# Altium footprint library CD's_LIB_2018.PcbLib: 155 footprints (part 9 of 10)
Each footprint in its own frame and in the unit in brackets; x right, y up, seen from the top. Pads: shape width x height; smd on the part's side, far side on the other; paste and mask are expansions set on the pad; w line width, h text height; cw(c..) or ccw(c..) is an arc to the next point about the centre after c.
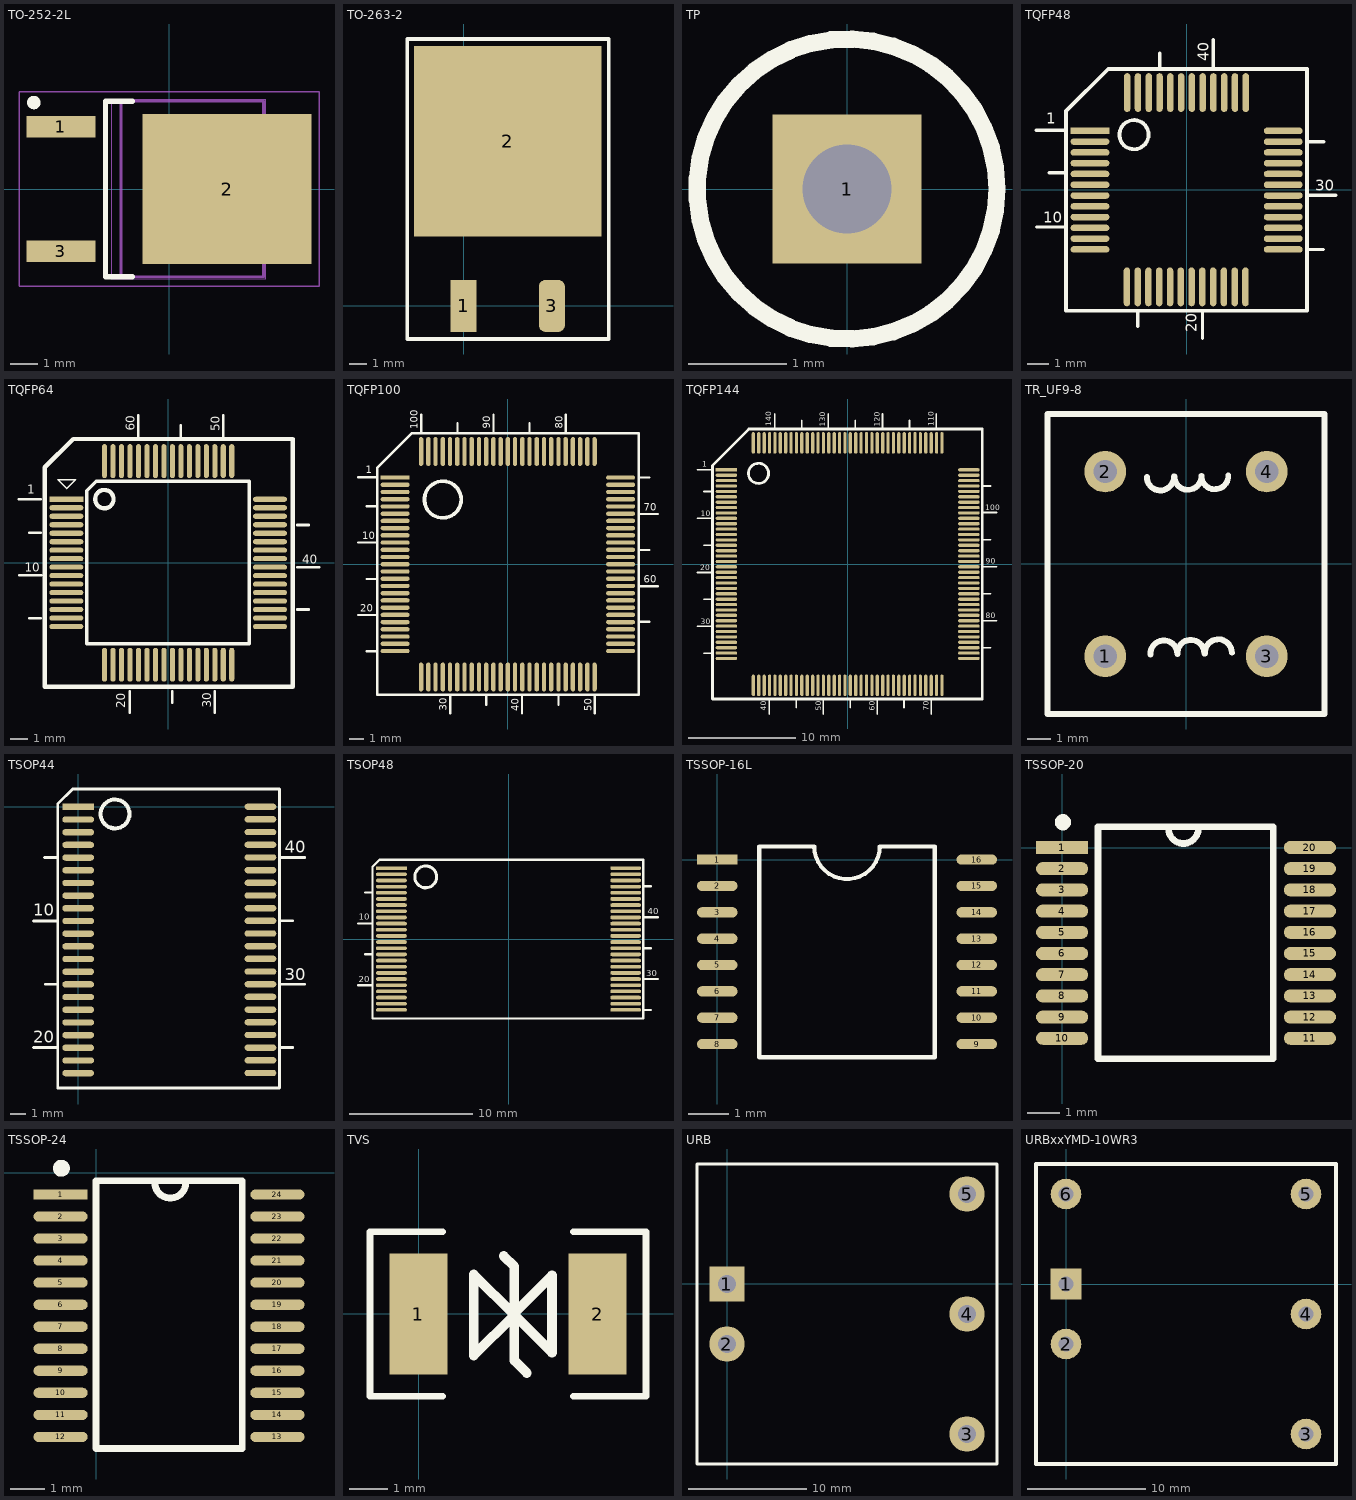
[diagram p8: the footprints below, top view; thin cyan lines are the x and y axes]

## TO-252-2L [mm]
height 2.4
pads (3):
  rect 2.55x0.8 smd: 1(-4,2.3) 3(-4,-2.3)
  rect 6.25x5.55 smd: 2(2.15,0)
Top Overlay:
  circle w0.25: c-5,3.2 r0.125
  lines w0.2: -1.35,-3.25 -2.35,-3.25 -2.35,3.25 -1.35,3.25
Top Paste:
  region: 2.51,0.36 4.55,0.36 4.55,2.06 2.51,2.06
  region: -0.25,0.36 1.79,0.36 1.79,2.06 -0.25,2.06
  region: 2.51,-2.06 4.55,-2.06 4.55,-0.36 2.51,-0.36
  region: -0.25,-2.06 1.79,-2.06 1.79,-0.36 -0.25,-0.36
Mechanical 1:
  lines w0.1: 3.5,-2.668 3.946,-2.668 4.85,-1.666 4.85,1.666 3.946,2.668 3.5,2.668 ; -1.778,-3.25 -1.778,3.25 3.5,3.25 3.5,-3.25 -1.778,-3.25
Mechanical 16:
  circle w0.05: c0,0 r0.35
  lines w0.001: -2.125,-3.325 -2.125,3.325 3.575,3.325 3.575,-3.325 -2.125,-3.325
  lines w0.05: -0.5,0 0.5,0 ; 0,-0.5 0,0.5 ; -5.55,-3.6 -5.55,3.6 5.55,3.6 5.55,-3.6 -5.55,-3.6

## TO-263-2 [mm]
pads (3):
  rect 1.5x3 smd: 1(0,0)
  rect 10.8x11 smd: 2(2.54,9.5)
  rrect50% 1.5x3 smd: 3(5.08,0)
Top Overlay:
  lines w0.203: -3.251,-1.909 8.357,-1.909 8.357,15.393 -3.251,15.393 -3.251,-1.909

## TP [mil]
pads (1):
  rect 60x60 hole 36: 1(0,0)
Top Overlay:
  circle w7: c0,0 r60.41

## TQFP48 [mm]
pads (48):
  rect 1.8x0.3 smd: 1(-4.483,2.731)
  oval 1.8x0.3 smd: 2(-4.483,2.231) 3(-4.483,1.731) 4(-4.483,1.231) 5(-4.483,0.731) 6(-4.483,0.231) 7(-4.483,-0.269) 8(-4.483,-0.769) 9(-4.483,-1.269) 10(-4.483,-1.769) 11(-4.483,-2.269) 12(-4.483,-2.769) 25(4.483,-2.769) 26(4.483,-2.269) 27(4.483,-1.769) 28(4.483,-1.269) 29(4.483,-0.769) 30(4.483,-0.269) 31(4.483,0.231) 32(4.483,0.731) 33(4.483,1.231) 34(4.483,1.731) 35(4.483,2.231) 36(4.483,2.731)
  oval 0.3x1.8 smd: 13(-2.769,-4.508) 14(-2.269,-4.508) 15(-1.769,-4.508) 16(-1.269,-4.508) 17(-0.769,-4.508) 18(-0.269,-4.508) 19(0.231,-4.508) 20(0.731,-4.508) 21(1.231,-4.508) 22(1.731,-4.508) 23(2.231,-4.508) 24(2.73,-4.508) 37(2.744,4.509) 38(2.244,4.509) 39(1.744,4.509) 40(1.244,4.509) 41(0.744,4.509) 42(0.244,4.509) 43(-0.256,4.509) 44(-0.756,4.509) 45(-1.256,4.509) 46(-1.756,4.509) 47(-2.256,4.509) 48(-2.756,4.509)
Top Overlay:
  circle w0.178: c-2.442,2.553 r0.676
  lines w0.152: -6.988,2.764 -5.718,2.764 ; -6.962,-1.732 -5.692,-1.732 ; -6.378,0.783 -5.718,0.783 ; -2.263,-6.329 -2.263,-5.669 ; -1.247,5.685 -1.247,6.345 ; 0.734,-6.888 0.734,-5.618 ; 1.242,5.685 1.242,6.955 ; 5.662,-0.259 6.932,-0.259 ; 5.687,-2.773 6.347,-2.773 ; 5.712,2.23 6.373,2.23
  lines w0.178: -5.591,-5.618 -5.591,3.655 -3.637,5.609 5.585,5.609 5.585,-5.618 -5.591,-5.618
  text "40" at 1.039,5.964 h0.51
  text "20" at 0.48,-6.609 h0.51
  text "10" at -6.657,-1.529 h0.51
  text "1" at -6.505,3.069 h0.51
  text "30" at 5.966,-0.056 h0.51
3D body: height 1.1, standoff 0, extent -4.509,-4.508 4.509,4.509

## TQFP64 [mm]
height 1.4
pads (64):
  rect 2x0.3 smd mask+0.102: 1(-6,3.75)
  oval 2x0.3 smd mask+0.102: 2(-6,3.25) 3(-6,2.75) 4(-6,2.25) 5(-6,1.75) 6(-6,1.25) 7(-6,0.75) 8(-6,0.25) 9(-6,-0.25) 10(-6,-0.75) 11(-6,-1.25) 12(-6,-1.75) 13(-6,-2.25) 14(-6,-2.75) 15(-6,-3.25) 16(-6,-3.75) 33(6,-3.75) 34(6,-3.25) 35(6,-2.75) 36(6,-2.25) 37(6,-1.75) 38(6,-1.25) 39(6,-0.75) 40(6,-0.25) 41(6,0.25) 42(6,0.75) 43(6,1.25) 44(6,1.75) 45(6,2.25) 46(6,2.75) 47(6,3.25) 48(6,3.75)
  oval 0.3x2 smd mask+0.102: 17(-3.75,-6) 18(-3.25,-6) 19(-2.75,-6) 20(-2.25,-6) 21(-1.75,-6) 22(-1.25,-6) 23(-0.75,-6) 24(-0.25,-6) 25(0.25,-6) 26(0.75,-6) 27(1.25,-6) 28(1.75,-6) 29(2.25,-6) 30(2.75,-6) 31(3.25,-6) 32(3.75,-6) 49(3.75,6) 50(3.25,6) 51(2.75,6) 52(2.25,6) 53(1.75,6) 54(1.25,6) 55(0.75,6) 56(0.25,6) 57(-0.25,6) 58(-0.75,6) 59(-1.25,6) 60(-1.75,6) 61(-2.25,6) 62(-2.75,6) 63(-3.25,6) 64(-3.75,6)
Top Overlay:
  circle w0.254: c-3.759,3.759 r0.544
  lines w0.1: -6.488,4.9 -5.463,4.9 -5.975,4.388 -6.488,4.9 ; -6.488,4.9 -6.488,4.9
  lines w0.152: -8.788,3.759 -7.518,3.759 ; -8.763,-0.737 -7.493,-0.737 ; -8.179,-3.251 -7.518,-3.251 ; -8.179,1.778 -7.518,1.778 ; -2.261,-8.839 -2.261,-7.569 ; -1.753,7.442 -1.753,8.712 ; 0.254,-8.23 0.254,-7.569 ; 0.737,7.442 0.737,8.103 ; 2.743,-8.839 2.743,-7.569 ; 3.251,7.442 3.251,8.712 ; 7.62,-2.743 8.28,-2.743 ; 7.62,-0.254 8.89,-0.254 ; 7.62,2.235 8.28,2.235
  lines w0.203: -4.801,-4.75 -4.801,4.242 -4.242,4.801 4.775,4.801 4.775,-4.75 -4.801,-4.75
  lines w0.254: -7.27,-7.299 -7.27,5.633 -5.597,7.306 7.335,7.306 7.335,-7.299 -7.27,-7.299
  text "20" at -2.515,-8.56 h0.51
  text "10" at -8.458,-0.533 h0.51
  text "1" at -8.306,4.064 h0.51
  text "30" at 2.54,-8.534 h0.51
  text "50" at 3.048,7.747 h0.51
  text "40" at 7.899,-0.051 h0.51
  text "60" at -1.956,7.798 h0.51
3D body: height 1.58, standoff 0, extent -6.525,-6.525 6.525,6.525

## TQFP100 [mm]
pads (100):
  rect 2x0.3 smd: 1(-7.8,6)
  oval 2x0.3 smd: 2(-7.8,5.5) 3(-7.8,5) 4(-7.8,4.5) 5(-7.8,4) 6(-7.8,3.5) 7(-7.8,3) 8(-7.8,2.5) 9(-7.8,2) 10(-7.8,1.5) 11(-7.8,1) 12(-7.8,0.5) 13(-7.8,0) 14(-7.8,-0.5) 15(-7.8,-1) 16(-7.8,-1.5) 17(-7.8,-2) 18(-7.8,-2.5) 19(-7.8,-3) 20(-7.8,-3.5) 21(-7.8,-4) 22(-7.8,-4.5) 23(-7.8,-5) 24(-7.8,-5.5) 25(-7.8,-6) 51(7.8,-6) 52(7.8,-5.5) 53(7.8,-5) 54(7.8,-4.5) 55(7.8,-4) 56(7.8,-3.5) 57(7.8,-3) 58(7.8,-2.5) 59(7.8,-2) 60(7.8,-1.5) 61(7.8,-1) 62(7.8,-0.5) 63(7.8,0) 64(7.8,0.5) 65(7.8,1) 66(7.8,1.5) 67(7.8,2) 68(7.8,2.5) 69(7.8,3) 70(7.8,3.5) 71(7.8,4) 72(7.8,4.5) 73(7.8,5) 74(7.8,5.5) 75(7.8,6)
  oval 0.3x2 smd: 26(-6,-7.8) 27(-5.5,-7.8) 28(-5,-7.8) 29(-4.5,-7.8) 30(-4,-7.8) 31(-3.5,-7.8) 32(-3,-7.8) 33(-2.5,-7.8) 34(-2,-7.8) 35(-1.5,-7.8) 36(-1,-7.8) 37(-0.5,-7.8) 38(0,-7.8) 39(0.5,-7.8) 40(1,-7.8) 41(1.5,-7.8) 42(2,-7.8) 43(2.5,-7.8) 44(3,-7.8) 45(3.5,-7.8) 46(4,-7.8) 47(4.5,-7.8) 48(5,-7.8) 49(5.5,-7.8) 50(6,-7.8) 76(6,7.8) 77(5.5,7.8) 78(5,7.8) 79(4.5,7.8) 80(4,7.8) 81(3.5,7.8) 82(3,7.8) 83(2.5,7.8) 84(2,7.8) 85(1.5,7.8) 86(1,7.8) 87(0.5,7.8) 88(0,7.8) 89(-0.5,7.8) 90(-1,7.8) 91(-1.5,7.8) 92(-2,7.8) 93(-2.5,7.8) 94(-3,7.8) 95(-3.5,7.8) 96(-4,7.8) 97(-4.5,7.8) 98(-5,7.8) 99(-5.5,7.8) 100(-6,7.8)
Top Overlay:
  circle w0.254: c-4.498,4.476 r1.27
  lines w0.152: -10.365,-3.5 -9.095,-3.5 ; -10.365,1.504 -9.095,1.504 ; -10.365,6.025 -9.095,6.025 ; -9.756,-6.014 -9.095,-6.014 ; -9.756,-1.01 -9.095,-1.01 ; -9.756,4.019 -9.095,4.019 ; -5.997,9.099 -5.997,10.369 ; -3.99,-10.332 -3.99,-9.062 ; -3.482,9.099 -3.482,9.759 ; -1.501,-9.723 -1.501,-9.062 ; -0.993,9.099 -0.993,10.369 ; 0.988,-10.332 0.988,-9.062 ; 1.496,9.099 1.496,9.759 ; 3.503,-9.723 3.503,-9.062 ; 4.011,9.099 4.011,10.369 ; 6.018,-10.332 6.018,-9.062 ; 9.116,-3.982 9.777,-3.982 ; 9.116,-1.518 10.386,-1.518 ; 9.116,0.996 9.777,0.996 ; 9.116,3.485 10.386,3.485 ; 9.116,6 9.777,6
  lines w0.178: -9.045,-9.037 9.066,-9.037 9.066,9.048 -6.657,9.048 -9.045,6.66 -9.045,-9.037
  text "100" at -6.225,9.353 h0.51
  text "90" at -1.221,9.378 h0.51
  text "80" at 3.782,9.378 h0.51
  text "70" at 9.396,3.714 h0.51
  text "60" at 9.396,-1.29 h0.51
  text "50" at 5.789,-10.154 h0.51
  text "40" at 0.76,-10.154 h0.51
  text "30" at -4.219,-10.129 h0.51
  text "20" at -10.213,-3.296 h0.51
  text "10" at -10.061,1.733 h0.51
  text "1" at -9.832,6.279 h0.51
3D body: height 1.61, standoff -0.01, extent -8.002,-7.993 7.998,8.007

## TQFP144 [mm]
pads (144):
  rect 2x0.3 smd: 1(-11.25,8.75)
  oval 2x0.3 smd: 2(-11.25,8.25) 3(-11.25,7.75) 4(-11.25,7.25) 5(-11.25,6.75) 6(-11.25,6.25) 7(-11.25,5.75) 8(-11.25,5.25) 9(-11.25,4.75) 10(-11.25,4.25) 11(-11.25,3.75) 12(-11.25,3.25) 13(-11.25,2.75) 14(-11.25,2.25) 15(-11.25,1.75) 16(-11.25,1.25) 17(-11.25,0.75) 18(-11.25,0.25) 19(-11.25,-0.25) 20(-11.25,-0.75) 21(-11.25,-1.25) 22(-11.25,-1.75) 23(-11.25,-2.25) 24(-11.25,-2.75) 25(-11.25,-3.25) 26(-11.25,-3.75) 27(-11.25,-4.25) 28(-11.25,-4.75) 29(-11.25,-5.25) 30(-11.25,-5.75) 31(-11.25,-6.25) 32(-11.25,-6.75) 33(-11.25,-7.25) 34(-11.25,-7.75) 35(-11.25,-8.25) 36(-11.25,-8.75) 73(11.25,-8.75) 74(11.25,-8.25) 75(11.25,-7.75) 76(11.25,-7.25) 77(11.25,-6.75) 78(11.25,-6.25) 79(11.25,-5.75) 80(11.25,-5.25) 81(11.25,-4.75) 82(11.25,-4.25) 83(11.25,-3.75) 84(11.25,-3.25) 85(11.25,-2.75) 86(11.25,-2.25) 87(11.25,-1.75) 88(11.25,-1.25) 89(11.25,-0.75) 90(11.25,-0.25) 91(11.25,0.25) 92(11.25,0.75) 93(11.25,1.25) 94(11.25,1.75) 95(11.25,2.25) 96(11.25,2.75) 97(11.25,3.25) 98(11.25,3.75) 99(11.25,4.25) 100(11.25,4.75) 101(11.25,5.25) 102(11.25,5.75) 103(11.25,6.25) 104(11.25,6.75) 105(11.25,7.25) 106(11.25,7.75) 107(11.25,8.25) 108(11.25,8.75)
  oval 0.3x2 smd: 37(-8.75,-11.25) 38(-8.25,-11.25) 39(-7.75,-11.25) 40(-7.25,-11.25) 41(-6.75,-11.25) 42(-6.25,-11.25) 43(-5.75,-11.25) 44(-5.25,-11.25) 45(-4.75,-11.25) 46(-4.25,-11.25) 47(-3.75,-11.25) 48(-3.25,-11.25) 49(-2.75,-11.25) 50(-2.25,-11.25) 51(-1.75,-11.25) 52(-1.25,-11.25) 53(-0.75,-11.25) 54(-0.25,-11.25) 55(0.25,-11.25) 56(0.75,-11.25) 57(1.25,-11.25) 58(1.75,-11.25) 59(2.25,-11.25) 60(2.75,-11.25) 61(3.25,-11.25) 62(3.75,-11.25) 63(4.25,-11.25) 64(4.75,-11.25) 65(5.25,-11.25) 66(5.75,-11.25) 67(6.25,-11.25) 68(6.75,-11.25) 69(7.25,-11.25) 70(7.75,-11.25) 71(8.25,-11.25) 72(8.75,-11.25) 109(8.75,11.25) 110(8.25,11.25) 111(7.75,11.25) 112(7.25,11.25) 113(6.75,11.25) 114(6.25,11.25) 115(5.75,11.25) 116(5.25,11.25) 117(4.75,11.25) 118(4.25,11.25) 119(3.75,11.25) 120(3.25,11.25) 121(2.75,11.25) 122(2.25,11.25) 123(1.75,11.25) 124(1.25,11.25) 125(0.75,11.25) 126(0.25,11.25) 127(-0.25,11.25) 128(-0.75,11.25) 129(-1.25,11.25) 130(-1.75,11.25) 131(-2.25,11.25) 132(-2.75,11.25) 133(-3.25,11.25) 134(-3.75,11.25) 135(-4.25,11.25) 136(-4.75,11.25) 137(-5.25,11.25) 138(-5.75,11.25) 139(-6.25,11.25) 140(-6.75,11.25) 141(-7.25,11.25) 142(-7.75,11.25) 143(-8.25,11.25) 144(-8.75,11.25)
Top Overlay:
  circle w0.254: c-8.271,8.42 r0.933
  lines w0.152: -13.968,8.75 -12.698,8.75 ; -13.942,-5.779 -12.672,-5.779 ; -13.942,-0.775 -12.672,-0.775 ; -13.942,4.254 -12.672,4.254 ; -13.358,-8.268 -12.698,-8.268 ; -13.358,-3.264 -12.698,-3.264 ; -13.358,1.74 -12.698,1.74 ; -13.358,6.743 -12.698,6.743 ; -7.262,-13.907 -7.262,-12.637 ; -6.78,12.662 -6.78,13.932 ; -4.773,-13.323 -4.773,-12.662 ; -4.265,12.687 -4.265,13.347 ; -2.258,-13.907 -2.258,-12.637 ; -1.801,12.662 -1.801,13.932 ; 0.256,-13.323 0.256,-12.662 ; 0.713,12.687 0.713,13.347 ; 2.745,-13.907 2.745,-12.637 ; 3.228,12.662 3.228,13.932 ; 5.235,-13.323 5.235,-12.662 ; 5.743,12.687 5.743,13.347 ; 7.749,-13.907 7.749,-12.637 ; 8.232,12.662 8.232,13.932 ; 12.575,-5.245 13.845,-5.245 ; 12.575,-0.242 13.845,-0.242 ; 12.575,4.788 13.845,4.788 ; 12.601,-7.76 13.261,-7.76 ; 12.601,-2.756 13.261,-2.756 ; 12.601,2.273 13.261,2.273 ; 12.601,7.251 13.261,7.251
  lines w0.254: -12.545,-12.51 12.499,-12.51 12.499,12.535 -9.167,12.535 -12.545,9.156 -12.545,-12.51
  text "130" at -2.081,12.738 h0.51
  text "140" at -7.084,12.789 h0.51
  text "120" at 2.999,12.763 h0.51
  text "110" at 7.978,12.789 h0.51
  text "100" at 12.753,5.016 h0.51
  text "90" at 12.804,0.038 h0.51
  text "80" at 12.804,-5.017 h0.51
  text "70" at 7.546,-13.602 h0.51
  text "60" at 2.517,-13.627 h0.51
  text "50" at -2.462,-13.602 h0.51
  text "40" at -7.567,-13.627 h0.51
  text "30" at -13.638,-5.576 h0.51
  text "20" at -13.663,-0.546 h0.51
  text "10" at -13.638,4.432 h0.51
  text "1" at -13.485,9.029 h0.51
3D body: height 1.9, standoff 0.01, extent -11.101,-11.101 11.101,11.101

## TR_UF9-8 [mm]
pads (4):
  round 1.8 hole 1: 1(-3.5,-4) 2(-3.5,4) 3(3.5,-4) 4(3.5,4)
Top Overlay:
  lines w0.254: -1.697,3.771 ccw(c-1.112,3.771) -0.529,3.796 ; -1.543,-3.923 cw(c-0.959,-3.898) -0.375,-3.898 cw(c0.208,-3.874) 0.793,-3.874 ; -0.503,3.797 ccw(c0.081,3.797) 0.665,3.821 ccw(c1.249,3.821) 1.833,3.845 ; 0.819,-3.873 cw(c1.402,-3.849) 1.986,-3.849 ; -6,-6.502 -6,6.498 6,6.498 6,-6.502 -6,-6.502
3D body: height 15.76, standoff -4, extent -5.5,-8 5.5,8

## TSOP44 [mm]
pads (44):
  rect 2x0.4 smd: 1(0.007,0.006)
  oval 2x0.4 smd: 2(0.007,-0.794) 3(0.007,-1.594) 4(0.007,-2.394) 5(0.007,-3.194) 6(0.007,-3.994) 7(0.007,-4.794) 8(0.007,-5.594) 9(0.007,-6.394) 10(0.007,-7.194) 11(0.007,-7.994) 12(0.007,-8.794) 13(0.007,-9.594) 14(0.007,-10.394) 15(0.007,-11.194) 16(0.007,-11.994) 17(0.007,-12.794) 18(0.007,-13.594) 19(0.007,-14.394) 20(0.007,-15.194) 21(0.007,-15.994) 22(0.007,-16.794) 23(11.507,-16.784) 24(11.507,-15.984) 25(11.507,-15.184) 26(11.507,-14.384) 27(11.507,-13.584) 28(11.507,-12.784) 29(11.507,-11.984) 30(11.507,-11.184) 31(11.507,-10.384) 32(11.507,-9.584) 33(11.507,-8.784) 34(11.507,-7.984) 35(11.507,-7.184) 36(11.507,-6.384) 37(11.507,-5.584) 38(11.507,-4.784) 39(11.507,-3.984) 40(11.507,-3.184) 41(11.507,-2.384) 42(11.507,-1.584) 43(11.507,-0.784) 44(11.507,0.016)
Top Overlay:
  circle w0.254: c2.333,-0.441 r0.909
  lines w0.178: -2.812,-15.173 -1.288,-15.173 ; -2.812,-7.197 -1.288,-7.197 ; -2.117,-3.184 -1.355,-3.184 ; -2.05,-11.185 -1.288,-11.185 ; 12.705,-17.723 -1.288,-17.723 -1.288,0.185 -0.339,1.134 12.714,1.134 12.714,-17.714 ; 12.777,-15.184 13.539,-15.184 ; 12.777,-11.184 14.301,-11.184 ; 12.777,-7.184 13.539,-7.184 ; 12.777,-3.184 14.301,-3.184
  text "20" at -2.828,-14.868 h0.76
  text "30" at 13.029,-10.921 h0.76
  text "40" at 13.055,-2.895 h0.76
  text "10" at -2.828,-6.867 h0.76
3D body: height 1.3, standoff -0.09, extent -0.114,-17.499 11.646,0.711

## TSOP48 [mm]
pads (48):
  rect 2.5x0.3 smd: 1(-9.5,5.75)
  oval 2.5x0.3 smd: 2(-9.5,5.25) 3(-9.5,4.75) 4(-9.5,4.25) 5(-9.5,3.75) 6(-9.5,3.25) 7(-9.5,2.75) 8(-9.5,2.25) 9(-9.5,1.75) 10(-9.5,1.25) 11(-9.5,0.75) 12(-9.5,0.25) 13(-9.5,-0.25) 14(-9.5,-0.75) 15(-9.5,-1.25) 16(-9.5,-1.75) 17(-9.5,-2.25) 18(-9.5,-2.75) 19(-9.5,-3.25) 20(-9.5,-3.75) 21(-9.5,-4.25) 22(-9.5,-4.75) 23(-9.5,-5.25) 24(-9.5,-5.75) 25(9.5,-5.75) 26(9.5,-5.25) 27(9.5,-4.75) 28(9.5,-4.25) 29(9.5,-3.75) 30(9.5,-3.25) 31(9.5,-2.75) 32(9.5,-2.25) 33(9.5,-1.75) 34(9.5,-1.25) 35(9.5,-0.75) 36(9.5,-0.25) 37(9.5,0.25) 38(9.5,0.75) 39(9.5,1.25) 40(9.5,1.75) 41(9.5,2.25) 42(9.5,2.75) 43(9.5,3.25) 44(9.5,3.75) 45(9.5,4.25) 46(9.5,4.75) 47(9.5,5.25) 48(9.5,5.75)
Top Overlay:
  circle w0.254: c-6.72,5.037 r0.885
  lines w0.178: -12.211,-3.751 -11.024,-3.751 ; -12.211,1.252 -11.024,1.252 ; -11.652,-1.237 -11.024,-1.237 ; -11.652,3.767 -11.024,3.767 ; 10.922,-5.758 11.55,-5.758 ; 10.922,-3.243 12.109,-3.243 ; 10.922,-0.754 11.55,-0.754 ; 10.922,4.275 11.55,4.275 ; 10.935,1.76 12.122,1.76 ; -11.024,-6.442 10.922,-6.442 10.922,6.434 -10.467,6.434 -11.024,5.877 -11.024,-6.442
  text "40" at 11.284,1.989 h0.51
  text "30" at 11.182,-3.015 h0.51
  text "20" at -12.16,-3.523 h0.51
  text "10" at -12.135,1.557 h0.51
3D body: height 1.1, standoff 0, extent -10.002,-6 10.002,6

## TSSOP-16L [mm]
height 1.2
pads (16):
  rect 1x0.254 smd: 1(0,0)
  oval 1x0.254 smd: 2(0,-0.65) 3(0,-1.3) 4(0,-1.95) 5(0,-2.6) 6(0,-3.25) 7(0,-3.9) 8(0,-4.55) 9(6.4,-4.55) 10(6.4,-3.9) 11(6.4,-3.25) 12(6.4,-2.6) 13(6.4,-1.95) 14(6.4,-1.3) 15(6.4,-0.65) 16(6.4,0)
Top Overlay:
  lines w0.1: 2.388,0.325 1.035,0.325 1.035,-4.875 5.365,-4.875 5.365,0.325 4.013,0.325 ; 2.392,0.325 ccw(c3.2,0.325) 4.008,0.325
3D body: height 1.2, standoff 0, extent -0.002,-4.775 6.454,0.225

## TSSOP-20 [mm]
pads (20):
  rect 1.6x0.4 smd: 1(0,0)
  oval 1.6x0.4 smd: 2(0,-0.65) 3(0,-1.3) 4(0,-1.95) 5(0,-2.6) 6(0,-3.25) 7(0,-3.9) 8(0,-4.55) 9(0,-5.2) 10(0,-5.85) 11(7.6,-5.85) 12(7.6,-5.2) 13(7.6,-4.55) 14(7.6,-3.9) 15(7.6,-3.25) 16(7.6,-2.6) 17(7.6,-1.95) 18(7.6,-1.3) 19(7.6,-0.65) 20(7.6,0)
Top Overlay:
  circle w0.25: c0.025,0.775 r0.125
  lines w0.203: 3.263,0.581 ccw(c3.721,0.581) 4.179,0.581 ; 1.1,-6.477 6.477,-6.477 6.477,0.635 1.1,0.635 1.1,-6.477
3D body: height 1.84, standoff 0, extent -0.15,-6.55 7.75,0.75

## TSSOP-24 [mm]
pads (24):
  rect 1.6x0.3 smd: 1(-1.049,-0.635)
  oval 1.6x0.3 smd: 2(-1.049,-1.285) 3(-1.049,-1.935) 4(-1.049,-2.585) 5(-1.049,-3.235) 6(-1.049,-3.885) 7(-1.049,-4.535) 8(-1.049,-5.185) 9(-1.049,-5.835) 10(-1.049,-6.485) 11(-1.049,-7.135) 12(-1.049,-7.785) 13(5.351,-7.785) 14(5.351,-7.135) 15(5.351,-6.485) 16(5.351,-5.835) 17(5.351,-5.185) 18(5.351,-4.535) 19(5.351,-3.885) 20(5.351,-3.235) 21(5.351,-2.585) 22(5.351,-1.935) 23(5.351,-1.285) 24(5.351,-0.635)
Top Overlay:
  circle w0.25: c-1.024,0.14 r0.125
  lines w0.203: 1.731,-0.283 ccw(c2.189,-0.283) 2.647,-0.283 ; 0,-8.128 0,-0.229 4.31,-0.229 4.31,-8.128 0,-8.128

## TVS [mil]
pads (2):
  rect 60x125 smd: 1(-0.08,-0.1) 2(184.92,-0.1)
Top Overlay:
  lines w7: 24.92,-85.1 -50.08,-85.1 -50.08,84.9 24.92,84.9 ; 159.92,-85.1 234.92,-85.1 234.92,84.9 159.92,84.9
  lines w10: 87.92,59.9 98.92,48.9 98.92,-48.1 111.92,-61.1 ; 98.92,-2.1 98.92,-1.1 ; 98.92,0.9 137.92,39.9 137.92,-40.1 98.92,-1.1 ; 98.92,-1.1 56.92,-43.1 56.92,40.9 98.92,-1.1

## URB [mm]
pads (5):
  rect 3x3 hole 1.5: 1(0,-0.02)
  round 3 hole 1.5: 2(0,-5.1) 3(20.32,-12.72) 4(20.32,-2.56) 5(20.32,7.6)
Top Overlay:
  lines w0.254: -2.54,-15.26 -2.54,10.14 22.86,10.14 22.86,-15.26 -2.54,-15.26

## URBxxYMD-10WR3 [mm] "隔离DCDC模块"
pads (6):
  rect 2.6x2.6 hole 1.3: 1(0,0)
  round 2.6 hole 1.3: 2(0,-5.08) 3(20.32,-12.7) 4(20.32,-2.54) 5(20.32,7.62) 6(0,7.62)
Top Overlay:
  lines w0.3: -2.54,-15.24 22.86,-15.24 22.86,10.16 -2.54,10.16 -2.54,-15.24